# Altium footprint library CONN_W2B.PcbLib: 77 footprints (part 5 of 5)
Each footprint in its own frame and in the unit in brackets; x right, y up, seen from the top. Pads: shape width x height; smd on the part's side, far side on the other; paste and mask are expansions set on the pad; w line width, h text height; cw(c..) or ccw(c..) is an arc to the next point about the centre after c.
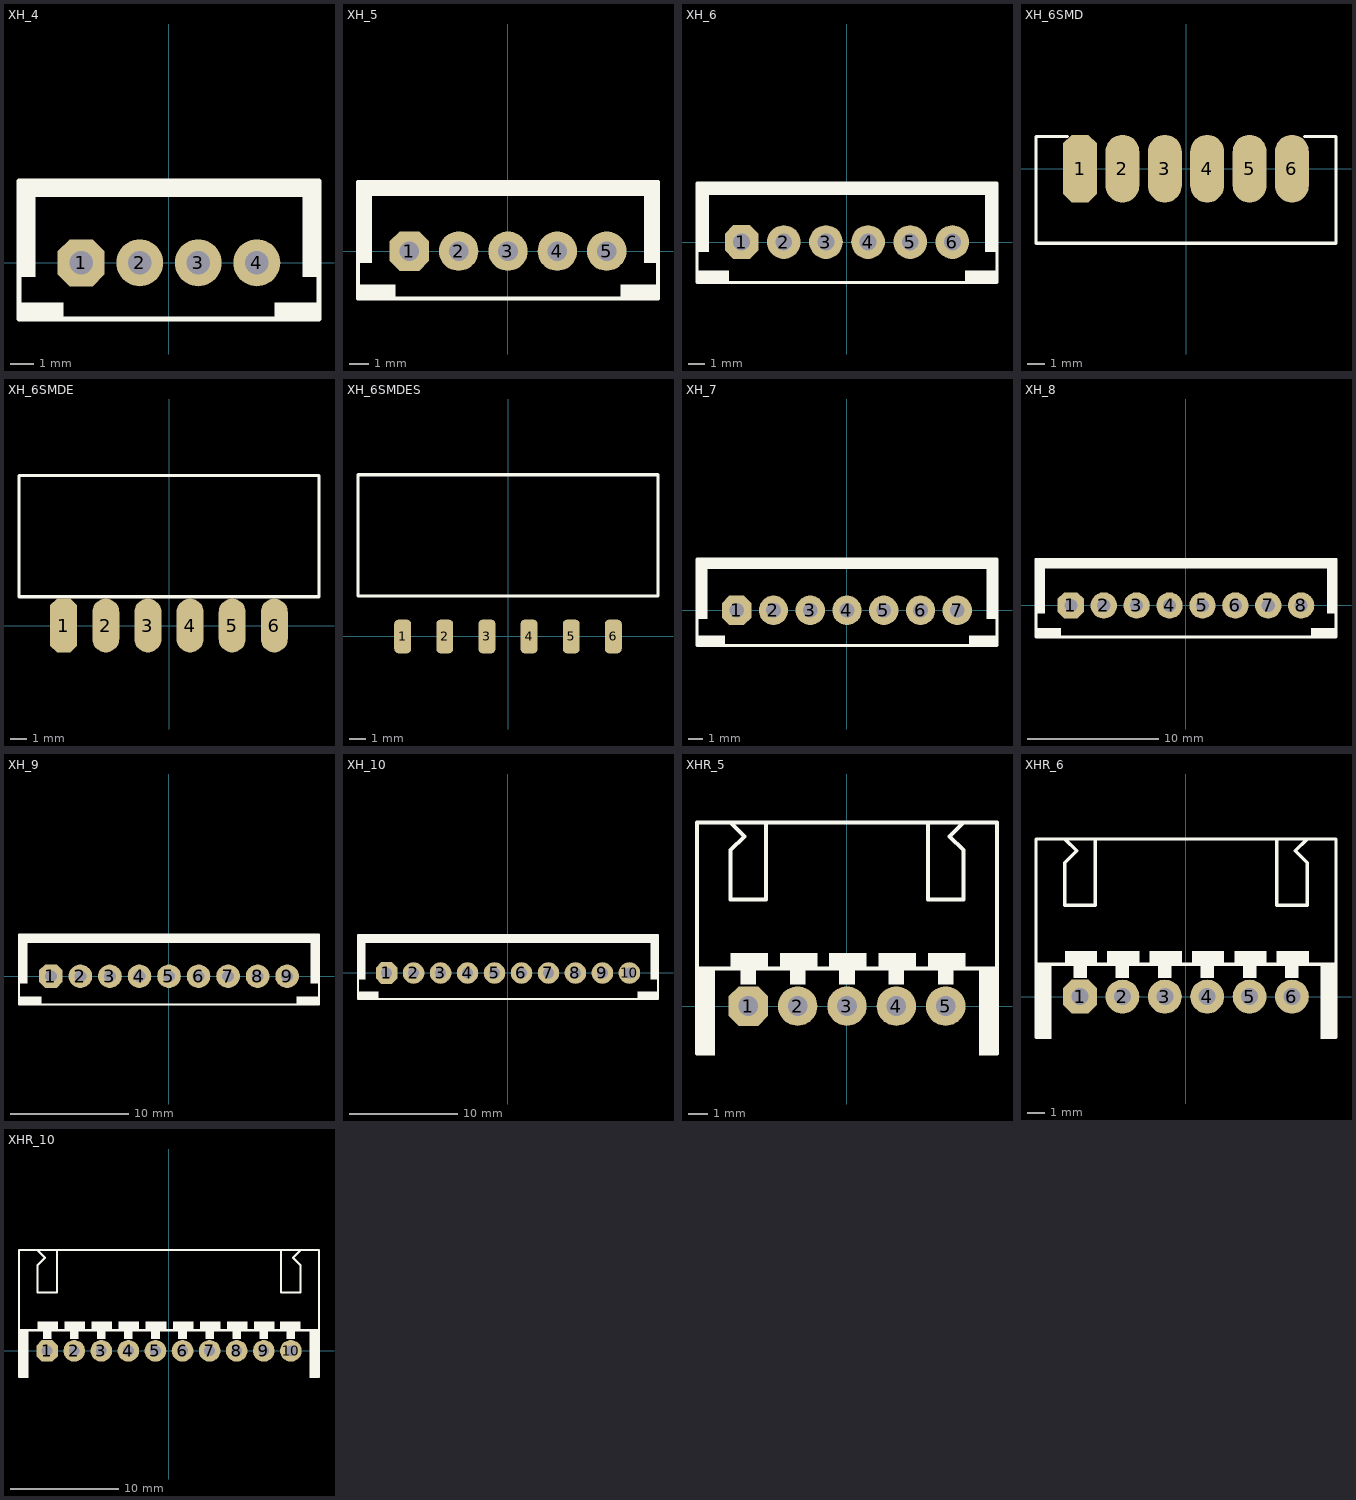
[diagram p4: the footprints below, top view; thin cyan lines are the x and y axes]

## XH_4 [mm] "PW10-xx-M, JST-BxB-XH-A pitch: 2.5mm"
pads (4):
  oct 2x2 hole 1: 1(-3.75,0)
  round 2 hole 1: 2(-1.25,0) 3(1.25,0) 4(3.75,0)
Top Overlay:
  region: 6.4,-1.7 4.5,-1.7 4.5,-2.4 6.4,-2.4
  region: 6.4,3.5 5.7,3.5 5.7,-0.6 6.4,-0.6
  region: -6.4,3.5 -6.4,2.8 6.4,2.8 6.4,3.5
  rectangle: -6.4,-0.6 -5.7,3.5
  rectangle: -6.4,-2.4 -4.5,-1.7
  lines w0.2: -6.4,-2.4 -6.4,3.5 6.4,3.5 6.4,-2.4 -6.4,-2.4
3D body "User Library-PW10-04-M white.step": height 7, standoff -3.3, extent -6.25,-2.3 6.25,3.4

## XH_5 [mm] "PW10-xx-M, JST-BxB-XH-A pitch: 2.5mm"
pads (5):
  oct 2x2 hole 1: 1(-5,0)
  round 2 hole 1: 2(-2.5,0) 3(0,0) 4(2.5,0) 5(5,0)
Top Overlay:
  rectangle: -7.6,-2.4 -5.7,-1.7
  rectangle: -7.6,-0.6 -6.9,3.5
  region: -7.6,3.5 -7.6,2.8 7.6,2.8 7.6,3.5
  region: 7.6,3.5 6.9,3.5 6.9,-0.6 7.6,-0.6
  region: 7.6,-1.7 5.7,-1.7 5.7,-2.4 7.6,-2.4
  lines w0.2: -7.6,-2.4 7.6,-2.4 7.6,3.5 -7.6,3.5 -7.6,-2.4
3D body "User Library-PW10-05-M white.step": height 7, standoff -3.3, extent -7.5,-2.3 7.5,3.4

## XH_6 [mm] "PW10-xx-M, JST-BxB-XH-A pitch: 2.5mm"
pads (6):
  oct 2x2 hole 1: 1(-6.25,0)
  round 2 hole 1: 2(-3.75,0) 3(-1.25,0) 4(1.25,0) 5(3.75,0) 6(6.25,0)
Top Overlay:
  rectangle: -8.9,-2.4 -7,-1.7
  rectangle: -8.9,-0.6 -8.2,3.5
  region: -8.9,3.5 -8.9,2.8 8.9,2.8 8.9,3.5
  region: 8.9,3.5 8.2,3.5 8.2,-0.6 8.9,-0.6
  region: 8.9,-1.7 7,-1.7 7,-2.4 8.9,-2.4
  lines w0.2: -8.9,-2.4 8.9,-2.4 8.9,3.5 -8.9,3.5 -8.9,-2.4
3D body "User Library-PW10-06-M white.step": height 7, standoff -3.3, extent -8.75,-2.3 8.75,3.4

## XH_6SMD [mm] "JST-SxB-XH-A pitch: 2.5mm"
pads (6):
  oct 2x4 smd: 1(-6.25,0)
  oval 2x4 smd: 2(-3.75,0) 3(-1.25,0) 4(1.25,0) 5(3.75,0) 6(6.25,0)
Top Overlay:
  lines w0.2: -7,1.9 -8.85,1.9 -8.85,-4.4 8.85,-4.4 8.85,1.9 7,1.9
3D body "S6B-XH-A.STEP": height 9.55, standoff -1.95, extent -8.7,-4.3 8.7,5.25

## XH_6SMDE [mm] "PW10-xx-M, JST-BxB-XH-A pitch: 2.5mm"
pads (6):
  oct 1.6x3.2 smd: 1(-6.25,0)
  oval 1.6x3.2 smd: 2(-3.75,0) 3(-1.25,0) 4(1.25,0) 5(3.75,0) 6(6.25,0)
Top Overlay:
  lines w0.2: -8.9,1.7 8.9,1.7 8.9,8.9 -8.9,8.9 -8.9,1.7
3D body "User Library-PW10-06-M white.step": height 3.7, standoff -2, extent -8.75,-1.5 8.75,8.8

## XH_6SMDES [mm] "PW10-xx-M, JST-BxB-XH-A pitch: 2.5mm"
pads (6):
  rrect50% 1x2 smd: 1(-6.25,0) 2(-3.75,0) 3(-1.25,0) 4(1.25,0) 5(3.75,0) 6(6.25,0)
Top Overlay:
  lines w0.2: -8.9,2.4 8.9,2.4 8.9,9.6 -8.9,9.6 -8.9,2.4
3D body "User Library-PW10-06-M white.step": height 3.7, standoff -2, extent -8.75,-0.8 8.75,9.5

## XH_7 [mm] "PW10-xx-M, JST-BxB-XH-A pitch: 2.5mm"
pads (7):
  oct 2x2 hole 1: 1(-7.5,0)
  round 2 hole 1: 2(-5,0) 3(-2.5,0) 4(0,0) 5(2.5,0) 6(5,0) 7(7.5,0)
Top Overlay:
  rectangle: -10.2,-2.4 -8.3,-1.7
  rectangle: -10.2,-0.6 -9.5,3.5
  region: -10.2,3.5 -10.2,2.8 10.2,2.8 10.2,3.5
  region: 10.2,3.5 9.5,3.5 9.5,-0.6 10.2,-0.6
  region: 10.2,-1.7 8.3,-1.7 8.3,-2.4 10.2,-2.4
  lines w0.2: -10.2,-2.4 10.2,-2.4 10.2,3.5 -10.2,3.5 -10.2,-2.4
3D body "User Library-PW10-07-M white.step": height 7, standoff -3.3, extent -10.05,-2.3 10.05,3.4

## XH_8 [mm] "PW10-xx-M, JST-BxB-XH-A pitch: 2.5mm"
pads (8):
  oct 2x2 hole 1: 1(-8.75,0)
  round 2 hole 1: 2(-6.25,0) 3(-3.75,0) 4(-1.25,0) 5(1.25,0) 6(3.75,0) 7(6.25,0) 8(8.75,0)
Top Overlay:
  region: 11.4,-1.7 9.5,-1.7 9.5,-2.4 11.4,-2.4
  region: 11.4,3.5 10.7,3.5 10.7,-0.6 11.4,-0.6
  region: -11.4,3.5 -11.4,2.8 11.4,2.8 11.4,3.5
  rectangle: -11.4,-0.6 -10.7,3.5
  rectangle: -11.4,-2.4 -9.5,-1.7
  lines w0.2: -11.4,-2.4 -11.4,3.5 11.4,3.5 11.4,-2.4 -11.4,-2.4
3D body "User Library-PW10-08-M white.step": height 7, standoff -3.3, extent -11.3,-2.3 11.3,3.4

## XH_9 [mm] "PW10-xx-M, JST-BxB-XH-A pitch: 2.5mm"
pads (9):
  oct 2x2 hole 1: 1(-10,0)
  round 2 hole 1: 2(-7.5,0) 3(-5,0) 4(-2.5,0) 5(0,0) 6(2.5,0) 7(5,0) 8(7.5,0) 9(10,0)
Top Overlay:
  rectangle: -12.7,-2.4 -10.8,-1.7
  rectangle: -12.7,-0.6 -12,3.5
  region: -12.7,3.5 -12.7,2.8 12.7,2.8 12.7,3.5
  region: 12.7,3.5 12,3.5 12,-0.6 12.7,-0.6
  region: 12.7,-1.7 10.8,-1.7 10.8,-2.4 12.7,-2.4
  lines w0.2: -12.7,-2.4 12.7,-2.4 12.7,3.5 -12.7,3.5 -12.7,-2.4
3D body "User Library-PW10-09-M white.step": height 7, standoff -3.3, extent -12.55,-2.3 12.55,3.4

## XH_10 [mm] "PW10-xx-M, JST-BxB-XH-A pitch: 2.5mm"
pads (10):
  oct 2x2 hole 1: 1(-11.25,0)
  round 2 hole 1: 2(-8.75,0) 3(-6.25,0) 4(-3.75,0) 5(-1.25,0) 6(1.25,0) 7(3.75,0) 8(6.25,0) 9(8.75,0) 10(11.25,0)
Top Overlay:
  region: 13.9,-1.7 12,-1.7 12,-2.4 13.9,-2.4
  region: 13.9,3.5 13.2,3.5 13.2,-0.6 13.9,-0.6
  region: -13.9,3.5 -13.9,2.8 13.9,2.8 13.9,3.5
  rectangle: -13.9,-0.6 -13.2,3.5
  rectangle: -13.9,-2.4 -12,-1.7
  lines w0.2: -13.9,-2.4 -13.9,3.5 13.9,3.5 13.9,-2.4 -13.9,-2.4
3D body "User Library-PW10-10-M white.step": height 7, standoff -3.3, extent -13.8,-2.3 13.8,3.4

## XHR_5 [mm] "JST-SxB-XH-A pitch: 2.5mm"
pads (5):
  oct 2x2 hole 1: 1(-5,0)
  round 2 hole 1: 2(-2.5,0) 3(0,0) 4(2.5,0) 5(5,0)
Top Overlay:
  rectangle: -7.6,-2.5 -6.7,1.9
  region: 7.6,1.9 6.7,1.9 6.7,-2.5 7.6,-2.5
  rectangle: -5.4,1.1 -4.6,1.9
  rectangle: -2.9,1.1 -2.1,1.9
  rectangle: -0.4,1.1 0.4,1.9
  rectangle: 2.1,1.1 2.9,1.9
  rectangle: 4.6,1.1 5.4,1.9
  rectangle: -5.9,1.9 -4,2.7
  rectangle: -3.4,1.9 -1.5,2.7
  rectangle: -0.9,1.9 1,2.7
  rectangle: 1.6,1.9 3.5,2.7
  rectangle: 4.1,1.9 6,2.7
  lines w0.2: -7.6,-2.4 -7.6,9.3 7.6,9.3 7.6,-2.4 ; -7.6,1.9 7.6,1.9 ; -5.9,9.3 -5.2,8.6 -5.9,7.9 ; -4.1,9.3 -4.1,5.4 -5.9,5.4 -5.9,7.9 ; 4.1,9.3 4.1,5.4 5.9,5.4 5.9,7.9 ; 5.9,9.3 5.2,8.6 5.9,7.9 ; -5.9,7.9 -5.9,7.9 ; 5.9,7.9 5.9,7.9
3D body "User Library-jst-s5b-xh-a.step": height 6.25, standoff -3.25, extent -7.45,-2.3 7.45,9.2

## XHR_6 [mm] "JST-SxB-XH-A pitch: 2.5mm"
pads (6):
  oct 2x2 hole 1: 1(-6.25,0)
  round 2 hole 1: 2(-3.75,0) 3(-1.25,0) 4(1.25,0) 5(3.75,0) 6(6.25,0)
Top Overlay:
  rectangle: -8.85,-2.5 -7.95,1.9
  region: 8.85,1.9 7.95,1.9 7.95,-2.5 8.85,-2.5
  rectangle: -6.65,1.1 -5.85,1.9
  rectangle: -4.15,1.1 -3.35,1.9
  rectangle: -1.65,1.1 -0.85,1.9
  rectangle: 0.85,1.1 1.65,1.9
  rectangle: 3.35,1.1 4.15,1.9
  rectangle: -7.15,1.9 -5.25,2.7
  rectangle: -4.65,1.9 -2.75,2.7
  rectangle: -2.15,1.9 -0.25,2.7
  rectangle: 0.35,1.9 2.25,2.7
  rectangle: 2.85,1.9 4.75,2.7
  rectangle: 5.35,1.9 7.25,2.7
  rectangle: 5.85,1.1 6.65,1.9
  lines w0.2: -8.85,-2.4 -8.85,9.3 8.85,9.3 8.85,-2.4 ; -8.85,1.9 8.85,1.9 ; -7.15,9.3 -6.45,8.6 -7.15,7.9 ; -5.35,9.3 -5.35,5.4 -7.15,5.4 -7.15,7.9 ; 5.35,9.3 5.35,5.4 7.15,5.4 7.15,7.9 ; 7.15,9.3 6.45,8.6 7.15,7.9 ; -7.15,7.9 -7.15,7.9 ; 7.15,7.9 7.15,7.9
3D body "S6B-XH-A.STEP": height 6.15, standoff -3.4, extent -8.7,-2.3 8.7,9.2

## XHR_10 [mm] "JST-SxB-XH-A pitch: 2.5mm"
pads (10):
  oct 2x2 hole 1: 1(-11.25,0)
  round 2 hole 1: 2(-8.75,0) 3(-6.25,0) 4(-3.75,0) 5(-1.25,0) 6(1.25,0) 7(3.75,0) 8(6.25,0) 9(8.75,0) 10(11.25,0)
Top Overlay:
  rectangle: 8.35,1.1 9.15,1.9
  rectangle: 7.85,1.9 9.75,2.7
  rectangle: 5.85,1.1 6.65,1.9
  rectangle: 5.35,1.9 7.25,2.7
  rectangle: 3.35,1.1 4.15,1.9
  rectangle: 2.85,1.9 4.75,2.7
  region: 12.15,2.7 10.25,2.7 10.25,1.9 12.15,1.9
  region: 11.65,1.9 10.85,1.9 10.85,1.1 11.65,1.1
  region: 13.85,1.9 12.95,1.9 12.95,-2.5 13.85,-2.5
  rectangle: -13.85,-2.5 -12.95,1.9
  rectangle: -11.65,1.1 -10.85,1.9
  rectangle: -9.15,1.1 -8.35,1.9
  rectangle: -6.65,1.1 -5.85,1.9
  rectangle: -4.15,1.1 -3.35,1.9
  rectangle: -1.65,1.1 -0.85,1.9
  rectangle: -12.15,1.9 -10.25,2.7
  rectangle: -9.65,1.9 -7.75,2.7
  rectangle: -7.15,1.9 -5.25,2.7
  rectangle: -4.65,1.9 -2.75,2.7
  rectangle: -2.15,1.9 -0.25,2.7
  rectangle: 0.35,1.9 2.25,2.7
  rectangle: 0.85,1.1 1.65,1.9
  lines w0.2: -13.85,-2.4 -13.85,9.3 13.85,9.3 13.85,-2.4 ; -13.85,1.9 13.85,1.9 ; -12.15,9.3 -11.45,8.6 -12.15,7.9 ; -10.35,9.3 -10.35,5.4 -12.15,5.4 -12.15,7.9 ; 10.35,9.3 10.35,5.4 12.15,5.4 12.15,7.9 ; 12.15,9.3 11.45,8.6 12.15,7.9 ; -12.15,7.9 -12.15,7.9 ; 12.15,7.9 12.15,7.9
3D body "S10B-XH-A.STEP": height 6.15, standoff -3.4, extent -13.7,-2.3 13.7,9.2